# Altium footprint library 逸芬的库鸭.PcbLib: 255 footprints (part 2 of 20)
Each footprint in its own frame and in the unit in brackets; x right, y up, seen from the top. Pads: shape width x height; smd on the part's side, far side on the other; paste and mask are expansions set on the pad; w line width, h text height; cw(c..) or ccw(c..) is an arc to the next point about the centre after c.
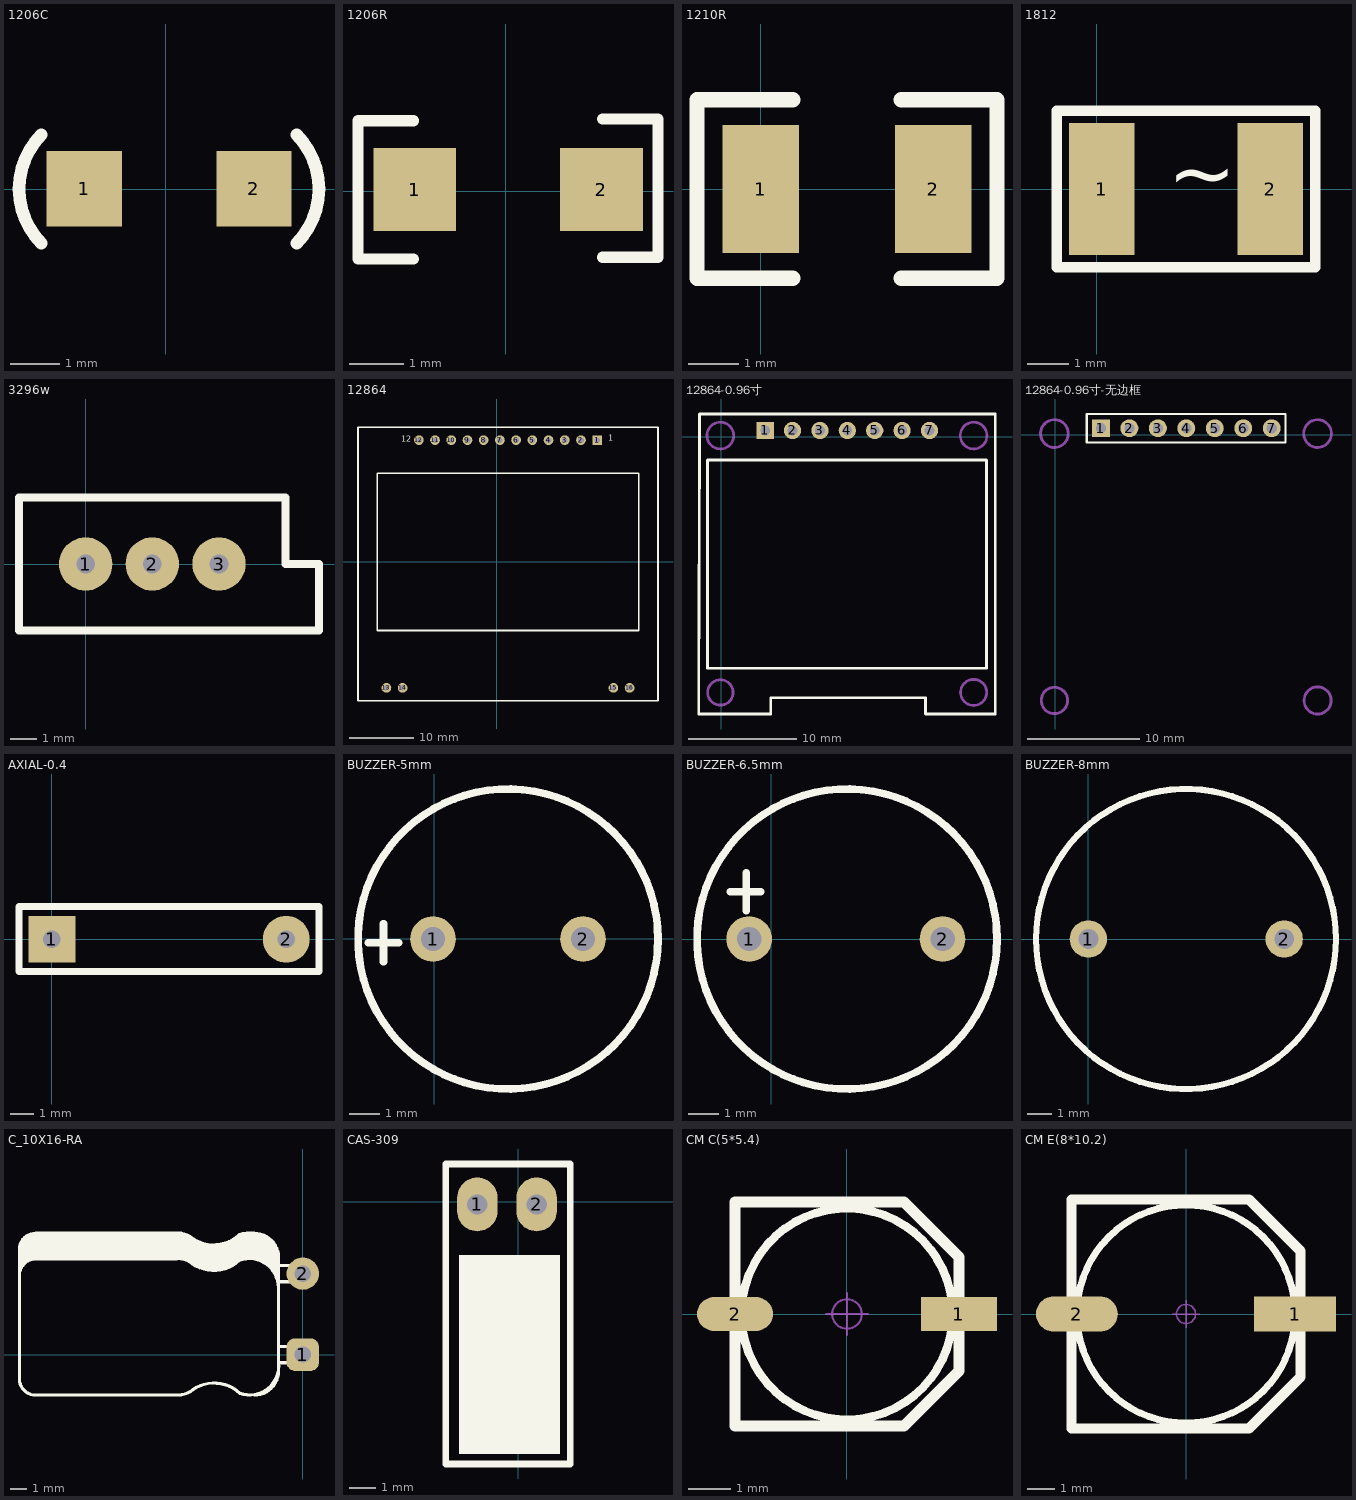
[diagram p1: the footprints below, top view; thin cyan lines are the x and y axes]

## 1206C [mil]
pads (2):
  rect 60x60 smd: 1(-64.9,0.2) 2(70.1,0.2)
Top Overlay:
  lines w10: -99,-43 cw(c-56,0) -99,43 ; 104,-43 ccw(c61,0) 104,43
3D body "Capacitor 1206 SMD.step": height 37.4, standoff -0.39, extent -81.71,-36.1 83.64,34.77

## 1206R [mil]
pads (2):
  rect 60x60 smd: 1(-65.9,1.2) 2(69.1,1.2)
Top Overlay:
  lines w8: -66.9,-49 -107,-49 -107,51 -66.9,51 ; 70,-47.8 110.1,-47.8 110.1,52.2 70,52.2
3D body "R1206.STEP": height 23.62, standoff 0, extent -62.99,-30.49 63,32.5

## 1210R [mil]
pads (2):
  rect 60x100 smd: 1(0,0) 2(135,0)
Top Overlay:
  lines w12: 25,-70 -50,-70 -50,70 25,70 ; 110,-70 185,-70 185,70 110,70
3D body "RES1210.STEP": height 67.1, standoff 0, extent -11.74,-48.99 145.76,49

## 1812 [mm]
pads (2):
  rect 1.6x3.2 smd: 1(0.127,0) 2(4.227,0)
Top Overlay:
  lines w0.254: -0.973,-1.9 5.327,-1.9 5.327,1.9 -0.973,1.9 -0.973,-1.9
  text "~" at 1.727,-0.787 h2.5
3D body "Resistor 1812 SMD.step": height 1.6, standoff 0, extent -0.066,-1.6 4.434,1.6

## 3296w [mil]
pads (3):
  round 80 hole 28: 1(0,0) 2(100,0) 3(200,0)
Top Overlay:
  lines w12: -100,-100 -100,100 300,100 300,0 350,0 350,-100 -100,-100
3D body "CERMET TRIMMER SINGLE TURN 10MM 500MW SIDE ADJUST 3386W.step": height 375.2, standoff -196.85, extent -87.6,-96.16 287.6,94

## 12864 [mil]
pads (16):
  rect 60x60 hole 35: 1(620,748.78)
  round 60 hole 35: 2(520,748.78) 3(420,748.78) 4(320,748.78) 5(220,748.78) 6(120,748.78) 7(20,748.78) 8(-80,748.78) 9(-180,748.78) 10(-280,748.78) 11(-380,748.78) 12(-480,748.78) 13(-680,-778.78) 14(-580,-778.78) 15(720,-778.78) 16(820,-778.78)
Top Overlay:
  lines w10: -855.2,-857.52 -855.2,827.52 995.2,827.52 995.2,-857.52 -855.2,-857.52 ; -735.91,-424.84 -735.91,544.45 875.91,544.45 875.91,-424.84 -735.91,-424.84
  text "12" at -588.2,726.48 h60
  text "1" at 689.8,733.48 h60
3D body "HDR1X8_2.54mm.STEP": height 118.11, standoff -336.22, extent -522,695 278,795
3D body "HDR1X4_2.54mm.STEP": height 118.11, standoff -336.22, extent 278,695 678,795
3D body: height 30, standoff 0, extent -856,-861 994,830
3D body: height 45, standoff 30, extent -744,-427 879,545

## 12864-0.96寸 [mm]
pads (7):
  rect 1.6x1.6 hole 0.9: 1(4.061,0.59)
  round 1.6 hole 0.9: 2(6.601,0.59) 3(9.141,0.59) 4(11.681,0.59) 5(14.221,0.59) 6(16.761,0.59) 7(19.301,0.59)
Top Overlay:
  lines w0.254: -1.289,-2.232 -1.289,-21.46 24.592,-21.46 24.592,-2.156 -1.289,-2.156 ; 25.392,2.101 25.392,-25.699 18.92,-25.699 18.92,-24.199 4.592,-24.199 4.592,-25.699 -2.089,-25.699 -2.028,2.114 25.392,2.114
Mechanical 13:
  circle w0.254: c-0.089,-23.699 r1.176
  circle w0.254: c23.392,-23.699 r1.208
  circle w0.254: c-0.089,0.114 r1.239
  circle w0.254: c23.392,0.114 r1.238
3D body: height 0.25, standoff 0, extent -2.035,2.368 -2.035,2.368
3D body "User Library-128x64I2COLEDDisplayAdafruit.step": height 2.67, standoff -8.17, extent -1.724,-25.564 24.976,2.296

## 12864-0.96寸-无边框 [mm] "12864-0.96寸-无边框"
pads (7):
  rect 1.6x1.6 hole 0.9: 1(4.061,0.59)
  round 1.6 hole 0.9: 2(6.601,0.59) 3(9.141,0.59) 4(11.681,0.59) 5(14.221,0.59) 6(16.761,0.59) 7(19.301,0.59)
Top Overlay:
  lines w0.2: 20.52,-0.68 2.791,-0.68 2.791,1.86 20.52,1.86 20.52,-0.655
Mechanical 13:
  circle w0.254: c-0.089,-23.699 r1.176
  circle w0.254: c23.392,-23.699 r1.208
  circle w0.254: c-0.089,0.114 r1.239
  circle w0.254: c23.392,0.114 r1.238
3D body "User Library-128x64I2COLEDDisplayAdafruit.step": height 8.47, standoff -2.37, extent -1.724,-25.564 24.976,2.296
3D body: height 8.54, standoff -3, extent 2.781,-0.68 20.561,1.86

## AXIAL-0.4 [mil]
pads (2):
  rect 80x80 hole 30: 1(0,0)
  round 80 hole 30: 2(400,0)
Top Overlay:
  lines w12: -56,-55 456,-55 456,56 -56,56 -56,-55
3D body "User Library-Capacitor no pol axial 0_4in pitch.STEP": height 166.09, standoff -141.73, extent -12.03,-62.35 408.04,64.37

## BUZZER-5mm [mil]
pads (2):
  round 60 hole 32 mask+0: 1(-1.46,-0.35) 2(195.39,-0.35)
Top Overlay:
  circle w10: c96.97,-0.35 r196.85
  lines w10: -86.46,-5.35 -46.46,-5.35 ; -66.46,-30.35 -66.46,19.65
3D body "蜂?": height 354.33, standoff -78.74, extent -142.67,-236.57 329.77,235.87

## BUZZER-6.5mm [mil]
pads (2):
  round 60 hole 32 mask+0: 1(-29,0) 2(224.85,0)
Top Overlay:
  circle w10: c99.43,0 r196.85
  lines w10: -54,62 -14,62 ; -33,37 -33,87
3D body "蜂?": height 354.33, standoff -78.74, extent -140.21,-236.21 332.23,236.23

## BUZZER-8mm [mil]
pads (2):
  round 60 hole 32 mask+0: 1(0,0) 2(314.96,0)
Top Overlay:
  circle w10: c157,0 r241.2
3D body "User Library-CEP2242_Buzzer.STEP": height 299, standoff -216.54, extent -111.5,-261.5 427.51,277.51

## C_10X16-RA [mm] "C-10X16_Horizontal"
height 10
pads (2):
  rrect50% 2x2 hole 1: 1(0,0)
  round 2 hole 1: 2(0,5)
Top Overlay:
  region: -16.783,7.51 -17.526,6.767 -17.526,5.319 -16.935,5.91 -7.11,5.91 -6.775,5.575 -4.168,5.575 -3.864,5.878 -3.378,5.878 -3.378,6.691 -3.734,7.047 -4.623,7.047 -4.877,6.793 -6.147,6.793 -6.375,7.021 -6.706,7.021 -7.194,7.51
  lines w0.2: -16.5,7.5 ccw(c-16.5,6.5) -17.5,6.5 -17.5,4.91 ; -16.5,7.503 -7.707,7.51 cw(c-7.707,6.11) -6.807,7.182 ; -7.782,5.91 -8.182,5.91 -16.5,5.91 ccw(c-16.5,4.91) -17.5,4.91 ; -7.707,5.935 cw(c-7.707,4.535) -6.807,5.607 ; -7.682,-2.49 ccw(c-7.682,-1.09) -6.782,-2.162 ; -7.65,-2.5 -16.5,-2.5 cw(c-16.5,-1.5) -17.5,-1.5 -17.5,0.5 -17.5,4.303 -17.5,4.91 ; -6.846,5.623 ccw(c-5.507,7.535) -3.915,5.828 ; -6.846,7.198 ccw(c-5.507,9.11) -3.915,7.403 ; -6.821,-2.178 cw(c-5.482,-4.09) -3.89,-2.383 ; -3.923,5.826 cw(c-3.307,4.135) -1.507,4.135 ; -3.923,7.401 cw(c-3.307,5.71) -1.507,5.71 ; -3.898,-2.381 ccw(c-3.282,-0.69) -1.482,-0.69 ; -3.175,7.5 -3,7.5 cw(c-3,6) -1.5,6 -1.5,2.5 -1.5,-1 cw(c-3,-1) -3,-2.5 ; -1.5,-0.5 0,-0.5 ; -1.5,0.5 0,0.5 ; -1.5,4.5 0,4.5 ; -1.5,5.5 0,5.5
  lines w0.3: -16.027,7.125 -6.95,7.125 ; -15.951,7.3 -7.225,7.3 ; -7.15,5.9 -3.975,5.9 ; -6.775,5.7 -4.25,5.7 ; -6.625,5.575 -4.425,5.575 ; -6.275,5.425 -4.875,5.425 ; -4.575,6.775 -3.425,6.775 ; -4.325,6.925 -3.45,6.925 ; -4.1,7.1 -3.425,7.1 ; -3.825,7.275 -3.225,7.275 ; -3.35,6.1 -3.35,7.35 ; -3.15,6.05 -3.15,7.325 ; -2.925,6.075 -2.925,7.325 ; -2.7,5.95 -2.7,7.25 ; -2.475,5.825 -2.475,7.25 ; -2.225,5.7 -2.225,7.1 ; -2.025,5.575 -2.025,6.925 ; -1.825,5.375 -1.825,6.6 ; -1.625,5.05 -1.625,6.15
3D body "SW3dPS-Cap electro 10x16x5.0mm RA.STEP": height 9.93, standoff -3.78, extent -17.689,-2.525 0.3,7.526

## CAS-309 [mil]
pads (2):
  oval 60x80 hole 30: 1(-61,-4) 2(27,-4)
Top Overlay:
  rectangle: -88,-374 62,-79
  lines w10: -108,-389 -108,56 77,56 77,-389 -108,-389
3D body "User Library-32_768K.STEP": height 118.11, standoff 0, extent -75.11,-390.41 43,58.41

## CM C(5*5.4) [mm] "贴片电解电容，直径5mm，高5.4mm"
pads (2):
  rect 1.8x0.8 smd: 1(2.65,0)
  oval 1.8x0.8 smd: 2(-2.65,0)
Top Overlay:
  circle w0.2: c0,0 r2.5
  lines w0.254: -2.65,-2.65 -2.65,2.65 1.35,2.65 2.65,1.35 2.65,-1.35 1.35,-2.65 -2.65,-2.65
Mechanical 15:
  circle w0.05: c0,0 r0.35
  lines w0.05: -0.5,0 0.5,0 ; 0,-0.5 0,0.5
3D body "CM C(5X5.4).STEP": height 5.4, standoff -0.01, extent -2.95,-2.65 2.95,2.65

## CM E(8*10.2) [mm] "贴片电解电容，直径8mm，高10.2mm"
pads (2):
  rect 3x1.3 smd: 1(4,0)
  oval 3x1.3 smd: 2(-4,0)
Top Overlay:
  circle w0.254: c0,0 r4
  lines w0.381: -4.2,-4.2 -4.2,4.2 2.3,4.2 4.2,2.3 4.2,-2.3 2.3,-4.2 -4.2,-4.2
Mechanical 15:
  circle w0.05: c0,0 r0.35
  lines w0.05: -0.5,0 0.5,0 ; 0,-0.5 0,0.5
3D body "CM E(8X10.2).STEP": height 10.2, standoff -0.01, extent -4.5,-4.15 4.5,4.15